# Altium footprint library ADP_SMT.PcbLib: 204 footprints (part 8 of 15)
Each footprint in its own frame and in the unit in brackets; x right, y up, seen from the top. Pads: shape width x height; smd on the part's side, far side on the other; paste and mask are expansions set on the pad; w line width, h text height; cw(c..) or ccw(c..) is an arc to the next point about the centre after c.
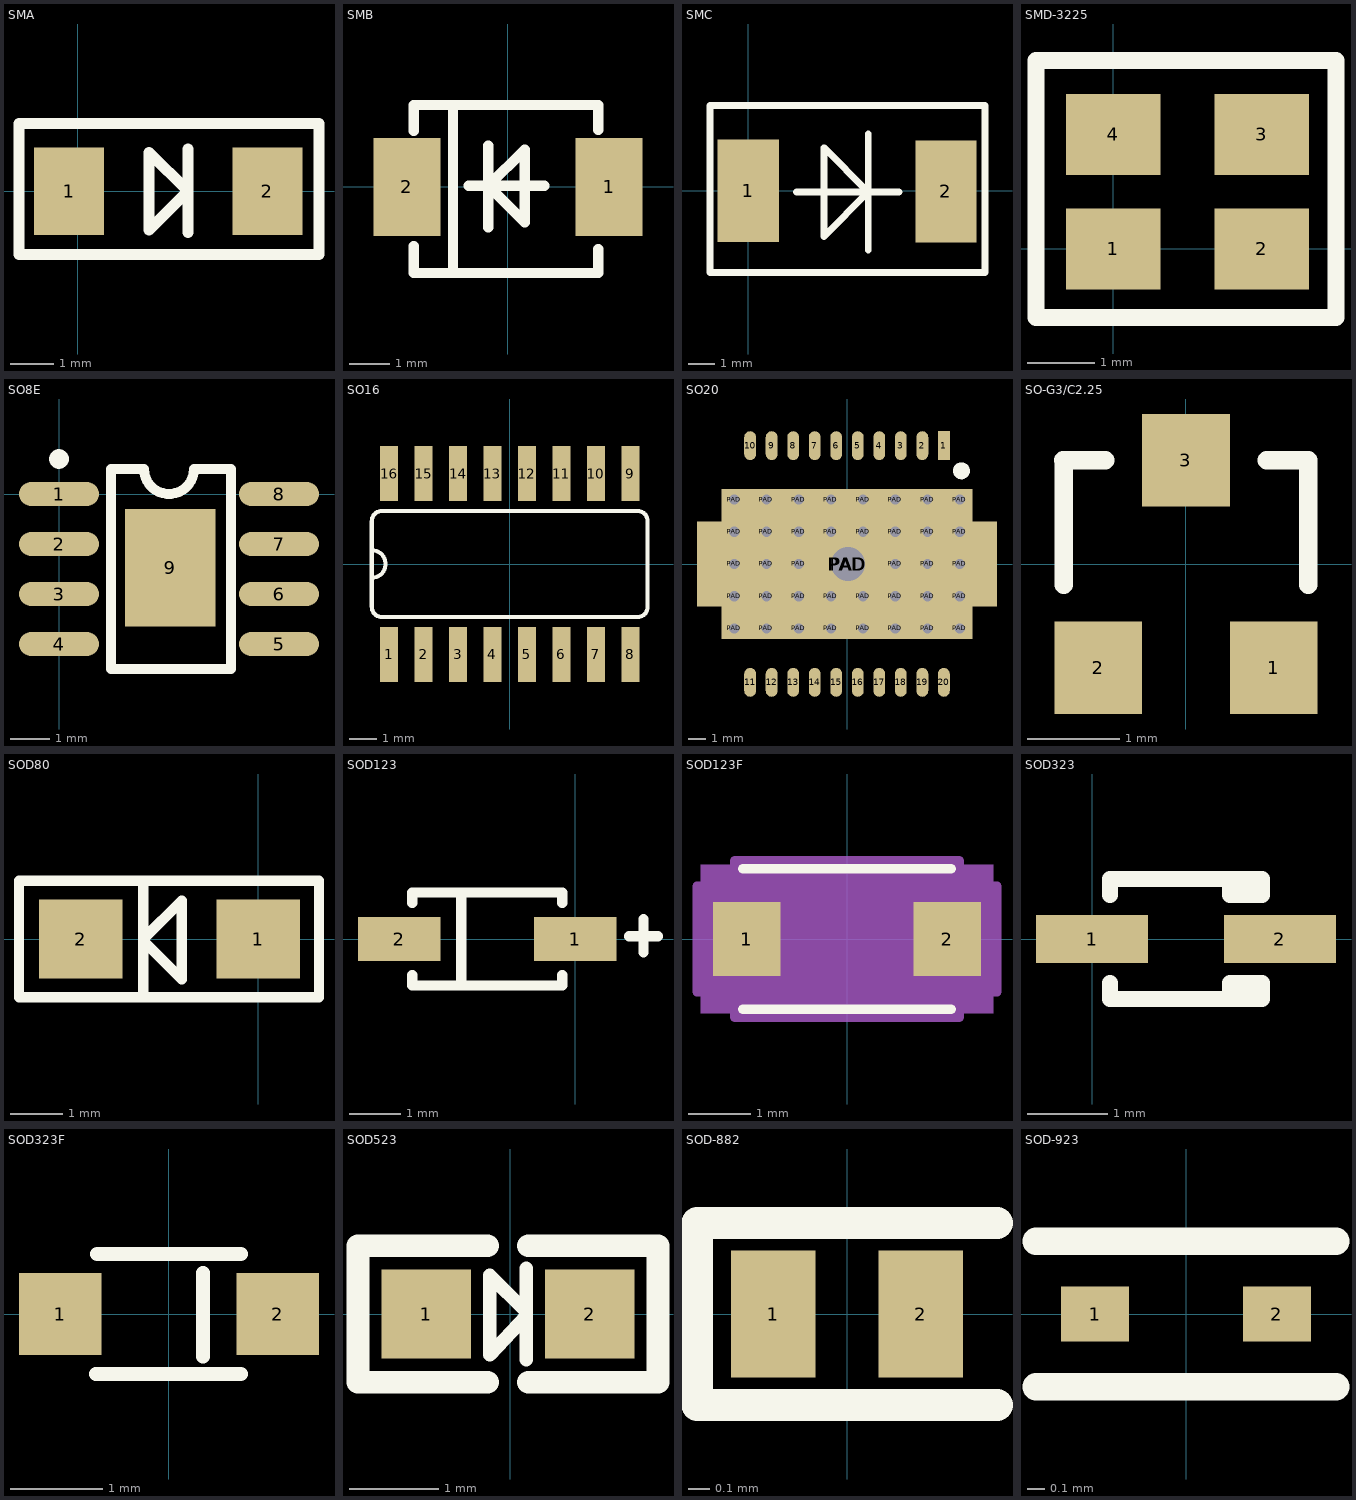
[diagram p7: the footprints below, top view; thin cyan lines are the x and y axes]

## SMA [mil] "DO-214AC(2010)"
pads (2):
  rect 63x78.74 smd: 1(-8,0) 2(170.56,0)
Top Overlay:
  lines w10: 99,-37 99,38 ; -53,-57 217,-57 217,61 -53,61 -53,-57 ; 64,-35 99,0 64,35 64,-35
3D body "DO-214AC.STEP": height 94.49, standoff 0, extent -7.55,-52.15 173.55,54.15

## SMB [mm] "DO-214AA"
pads (2):
  rect 1.65x2.4 smd: 1(2.475,0) 2(-2.475,0)
Top Overlay:
  lines w0.254: -2.311,-1.448 -2.311,-2.108 2.21,-2.108 2.21,-1.524 ; -2.311,1.372 -2.311,2.007 2.21,2.007 2.21,1.397 ; -1.346,-2.032 -1.346,2.007 ; -0.965,0.025 0.889,0.025 ; -0.483,-0.991 -0.483,1.016 ; -0.483,0.025 0.406,0.914 0.406,-0.864 -0.483,0.025
3D body "DI-214AA(SMB).step": height 2.45, standoff 0.03, extent -2.75,-1.975 2.75,1.925

## SMC [mil] "DO-214AB(2114)"
pads (2):
  rect 90x149.84 smd: 1(0,0)
  rect 90x149.63 smd: 2(290,-1)
Top Overlay:
  lines w10: 71,-2 221,-2 ; 176,-87 176,83 ; -56,-120 -56,125 347,125 347,-120 -56,-120 ; 111,-67 176,-2 111,63 111,-67
3D body "DO-214AB.STEP": height 106.3, standoff 0, extent -14.84,-117.09 304.84,127

## SMD-3225 [mm]
pads (4):
  rect 1.4x1.2 smd paste-2539.97: 1(0,0) 2(2.2,0) 3(2.2,1.7) 4(0,1.7)
Top Overlay:
  lines w0.254: -1.143,-1.016 3.302,-1.016 3.302,2.794 -1.143,2.794 -1.143,-1.016

## SO8E [mil]
pads (9):
  oval 80x24 smd: 1(0,0) 2(0,-50) 3(0,-100) 4(0,-150) 5(220,-150) 6(220,-100) 7(220,-50) 8(220,0)
  rect 90.55x117.72 smd: 9(111.23,-73.8)
Top Overlay:
  circle w9.84: c0,35 r4.92
  lines w10: 52,-175 52,25 85,25 ccw(c110,25) 135,25 172,25 172,-175 52,-175
3D body "SOP8.STEP": height 62.99, standoff 0, extent -7.7,-172.62 230.17,25.02

## SO16 [mil]
pads (16):
  rect 26x80 smd: 1(-175,-131) 2(-125,-131) 3(-75,-131) 4(-25,-131) 5(25,-131) 6(75,-131) 7(125,-131) 8(175,-131) 9(175,131) 10(125,131) 11(75,131) 12(25,131) 13(-25,131) 14(-75,131) 15(-125,131) 16(-175,131)
Top Overlay:
  lines w6: -200,-20 ccw(c-200,0) -200,20 ; -200,-20 -200,-62 ccw(c-185,-62) -185,-77 185,-77 ccw(c185,-62) 200,-62 200,62 ccw(c185,62) 185,77 -185,77 ccw(c-185,62) -200,62 -200,20 ; -200,-20 -200,20
3D body "User Library-SOP16_208mil (5_3mm).STEP": height 70.87, standoff -7.87, extent -200.78,-155.93 200.79,155.92

## SO20 [mm]
pads (63):
  rect 0.7x1.7 smd mask+0.07: 1(5.715,6.985)
  oval 0.7x1.7 smd mask+0.07: 2(4.445,6.985) 3(3.175,6.985) 4(1.905,6.985) 5(0.635,6.985) 6(-0.635,6.985) 7(-1.905,6.985) 8(-3.175,6.985) 9(-4.445,6.985) 10(-5.715,6.985) 11(-5.715,-6.985) 12(-4.445,-6.985) 13(-3.175,-6.985) 14(-1.905,-6.985) 15(-0.635,-6.985) 16(0.635,-6.985) 17(1.905,-6.985) 18(3.175,-6.985) 19(4.445,-6.985) 20(5.715,-6.985)
  round 0.9 hole 0.6 mask+0.06: PAD(-6.65,-3.8) PAD(-6.65,-1.9) PAD(-6.65,0) PAD(-6.65,1.9) PAD(-6.65,3.8) PAD(-4.75,-3.8) PAD(-4.75,-1.9) PAD(-4.75,0) PAD(-4.75,1.9) PAD(-4.75,3.8) PAD(-2.85,-3.8) PAD(-2.85,-1.9) PAD(-2.85,0) PAD(-2.85,1.9) PAD(-2.85,3.8) PAD(-0.95,-3.8) PAD(-0.95,-1.9) PAD(-0.95,1.9) PAD(-0.95,3.8) PAD(0.95,-3.8) PAD(0.95,-1.9) PAD(0.95,1.9) PAD(0.95,3.8) PAD(2.85,-3.8) PAD(2.85,-1.9) PAD(2.85,0) PAD(2.85,1.9) PAD(2.85,3.8) PAD(4.75,-3.8) PAD(4.75,-1.9) PAD(4.75,0) PAD(4.75,1.9) PAD(4.75,3.8) PAD(6.65,-3.8) PAD(6.65,-1.9) PAD(6.65,0) PAD(6.65,1.9) PAD(6.65,3.8)
  rect 14.8x8.828 smd mask+0.06: PAD(0,0)
  rect 9.8x6.2 smd mask+0.06: PAD(0,0)
  rect 17.7x3 smd mask+0.06: PAD(0,0)
  rect 17.7x5 smd mask+0.06: PAD(0,0)
  round 2.5 hole 2 mask+0.06: PAD(0.069,0)
Top Overlay:
  circle w0.5: c6.75,5.5 r0.25
3D body "User Library-PowerSO20.STEP": height 3.6, standoff 0, extent -8,-7.2 8,7.2

## SO-G3/C2.25 [mm] "SOT-23; 3 Leads; Body 3.0 x 2.5 mm, inc. leads (LxW max)"
height 1.2
pads (3):
  rect 0.95x1 smd: 1(0.95,-1.125) 2(-0.95,-1.125) 3(0,1.125)
Top Overlay:
  lines w0.2: -1.328,1.125 -0.875,1.125 ; -1.325,-0.225 -1.325,1.125 ; 0.875,1.125 1.325,1.125 1.325,-0.225
3D body "SOT-23.STEP": height 1.11, standoff 0.01, extent -1.503,-1.26 1.498,1.24

## SOD80 [mm] "LL34"
pads (2):
  rect 1.6x1.524 smd: 1(0,0) 2(-3.4,0)
Top Overlay:
  lines w0.2: -4.588,1.092 -4.588,-1.118 1.168,-1.118 1.168,1.067 ; -4.588,1.118 1.168,1.118 ; -2.2,-1.118 -2.2,1.118 ; -2.2,-0.035 -2.2,0 -1.463,0.737 -1.463,-0.772 -2.2,-0.035
3D body "SOD-80.STEP": height 1.5, standoff 0, extent -3.528,-0.75 -0.028,0.75

## SOD123 [mm] "1206"
pads (2):
  rect 1.6x0.85 smd: 1(0,0) 2(-3.4,0)
Top Overlay:
  lines w0.2: -3.15,-0.7 -3.15,-0.9 -0.25,-0.9 -0.25,-0.7 ; -3.15,0.7 -3.15,0.9 -0.25,0.9 -0.25,0.7 ; -2.2,-0.9 -2.2,0.9 ; 1.043,0.051 1.602,0.051 ; 1.323,-0.254 1.323,0.381
3D body "User Library-SOD-123_DiodesInc.STEP": height 1.42, standoff -0.03, extent -3.596,-0.853 0.254,0.847

## SOD123F [mil]
pads (2):
  rect 43x47 smd paste+0 mask+0: 1(-63.5,0) 2(63.5,0)
Top Overlay:
  lines w6: -66,-44.5 66,-44.5 ; -66,44.5 66,44.5
Mechanical 5:
  region: 92.5,-47 -92.5,-47 -92.5,47 92.5,47
Mechanical 13:
  lines w1: -61,-19.75 -41.25,-39.5 ; -61,19.75 -41.25,39.5 ; -77,-23.5 -77,23.5 -61,23.5 -61,-23.5 -77,-23.5 ; -61,-39.5 61,-39.5 61,39.5 -61,39.5 -61,-39.5 ; 61,-23.5 61,23.5 77,23.5 77,-23.5 61,-23.5
Mechanical 15:
  region: -71,-33.5 -95,-33.5 -95,33.5 -71,33.5 -71,49.5 71,49.5 71,33.5 95,33.5 95,-33.5 71,-33.5 71,-49.5 -71,-49.5
  lines w6: -95,-33.5 -95,33.5 -71,33.5 -71,49.5 71,49.5 71,33.5 95,33.5 95,-33.5 71,-33.5 71,-49.5 -71,-49.5 -71,-33.5 -95,-33.5
3D body "SOD-123F_LTF.step": height 42.99, standoff 0, extent -77.01,-39.49 77.01,39.49
3D body "SOD-123F_LTF.step": height 42.99, standoff 0, extent -77,-39.48 77.01,39.49

## SOD323 [mm] "0805"
pads (2):
  rect 1.4x0.6 smd: 1(0,0) 2(2.35,0)
Top Overlay:
  lines w0.2: 0.225,-0.55 0.225,-0.75 2.125,-0.75 2.125,-0.55 1.725,-0.55 1.725,-0.75 ; 0.225,0.55 0.225,0.75 2.125,0.75 2.125,0.55 1.725,0.55 1.725,0.75
3D body "SOD-323.STEP": height 1, standoff 0, extent -0.169,-0.667 2.431,0.633

## SOD323F [mil] "SODFL, 2-Leads, Body 1.30x2.60mm, IPC Medium Density"
height 39.37
pads (2):
  rect 35x35 smd: 1(-46.26,0) 2(46.26,0)
Top Overlay:
  lines w6: -31,-25.5 30.5,-25.5 ; -30.5,25.5 30.5,25.5 ; 14.44,-18 14.44,17.5
3D body "SOD323.step": height 39.37, standoff 0, extent -51.18,-27.56 51.18,27.56

## SOD523 [mm] "0603"
pads (2):
  rect 1x1 smd: 1(-0.94,0) 2(0.889,0)
Top Overlay:
  lines w0.152: 0.178,-0.508 0.178,0.508 ; 0.178,-0.025 -0.229,-0.457 -0.229,0.432 0.178,0.025
  lines w0.254: -0.254,-0.762 -1.702,-0.762 -1.702,0.762 -0.254,0.762 ; 0.203,-0.762 1.651,-0.762 1.651,0.762 0.203,0.762
3D body "SOD-523.STEP": height 0.65, standoff 0, extent -0.813,-0.381 0.787,0.419

## SOD-882 [mm]
height 0.5
pads (2):
  rect 0.4x0.6 smd: 1(-0.35,0) 2(0.35,0)
Top Overlay:
  lines w0.152: 0.711,-0.432 -0.711,-0.432 -0.711,0.432 0.711,0.432
3D body "SOD-882.STEP": height 0.5, standoff 0, extent -0.52,-0.32 0.52,0.32

## SOD-923 [mil]
pads (2):
  rect 15x12 smd: 1(-20,0) 2(20,0)
Top Overlay:
  lines w6: -33,-16 33,-16 ; -33,16 33,16
3D body "SOD-923.STEP": height 15.75, standoff 0, extent -20.87,-12.7 20.47,12.8